# Altium footprint library CeleronLib_THD.PcbLib: 217 footprints (part 7 of 14)
Each footprint in its own frame and in the unit in brackets; x right, y up, seen from the top. Pads: shape width x height; smd on the part's side, far side on the other; paste and mask are expansions set on the pad; w line width, h text height; cw(c..) or ccw(c..) is an arc to the next point about the centre after c.
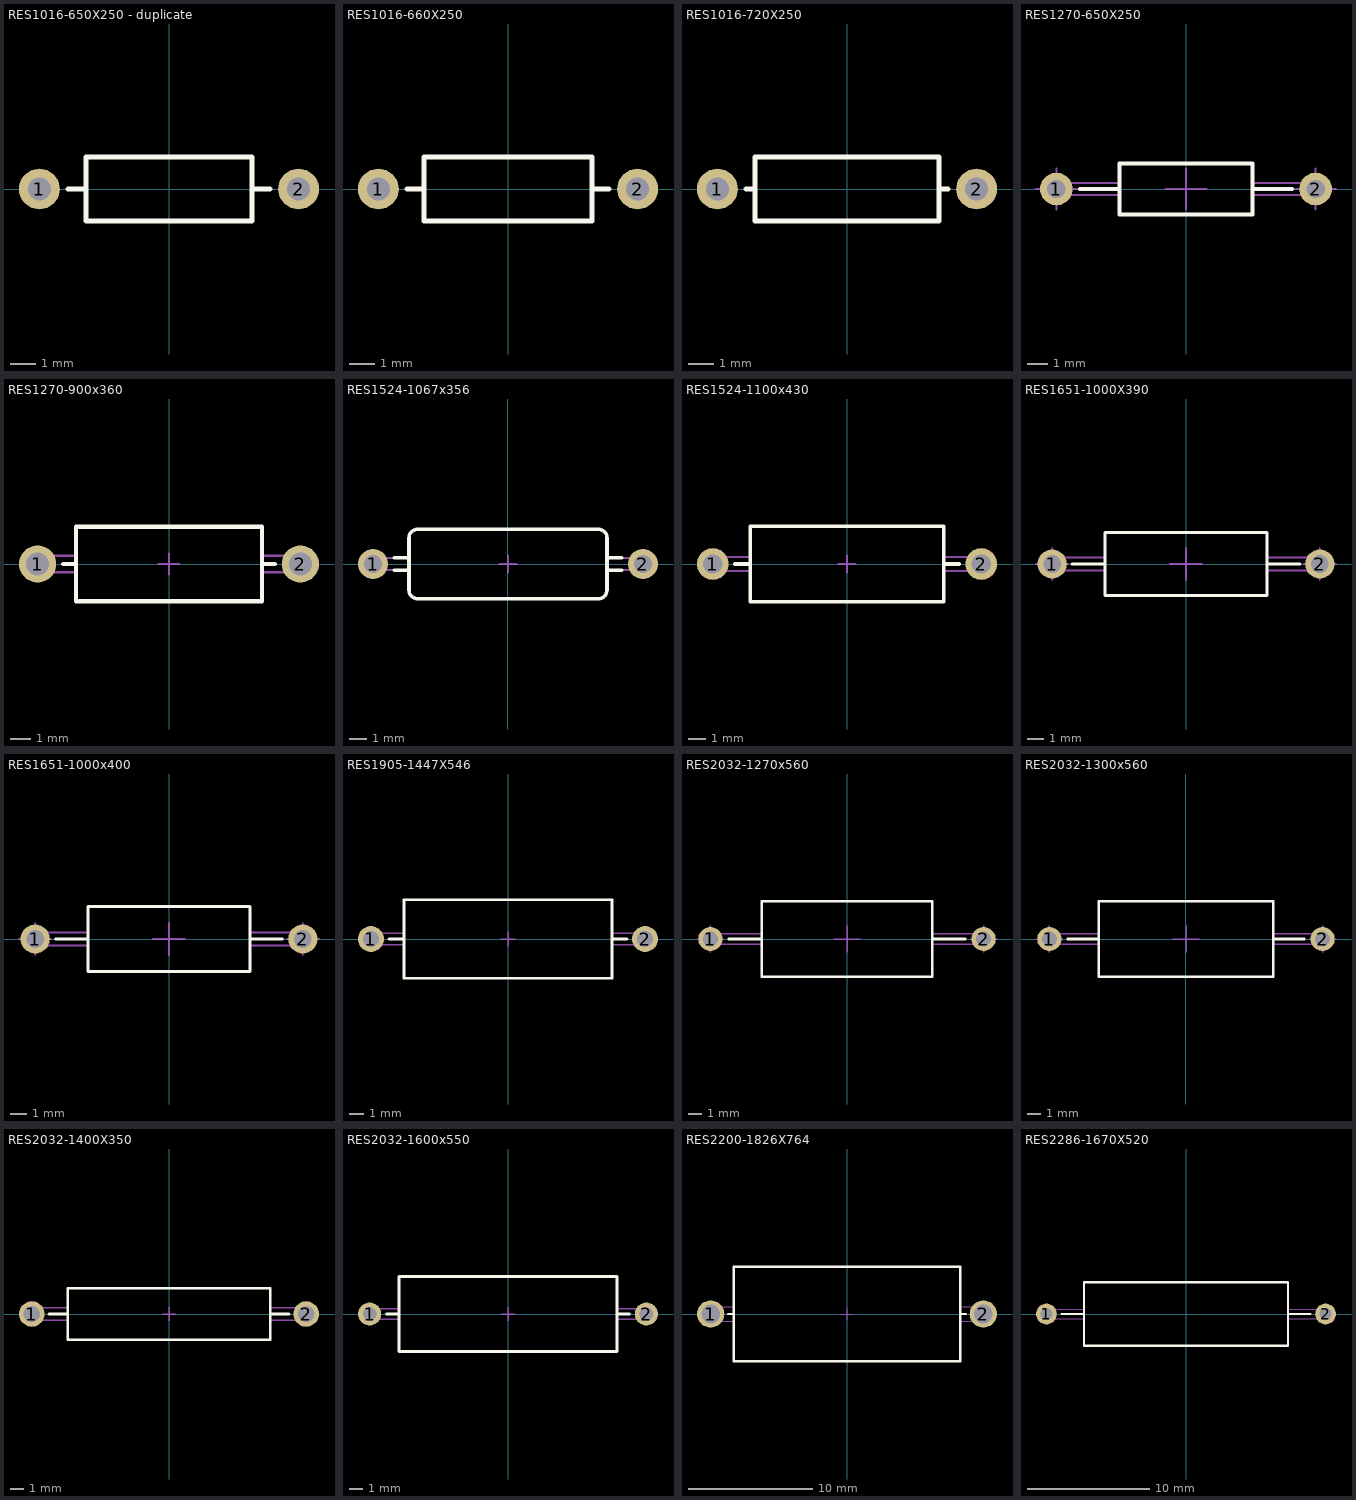
[diagram p6: the footprints below, top view; thin cyan lines are the x and y axes]

## RES1016-650X250 - duplicate [mm] "Resistor, Axial, Pad spacing 10.16 mm - Body Lengh 6.5mm X Body Diameter 2.5mm"
height 2.5
pads (2):
  round 1.6 hole 0.9: 1(-5.08,0) 2(5.08,0)
Top Overlay:
  lines w0.2: -3.95,0 -3.25,0 ; 3.25,0 3.95,0 ; -3.25,-1.25 -3.25,1.25 3.25,1.25 3.25,-1.25 -3.25,-1.25
Top Assy:
  lines w0.1: -3.95,0 -3.25,0 ; 3.25,0 3.95,0 ; -3.25,-1.25 3.25,-1.25 3.25,1.25 -3.25,1.25 -3.25,-1.25
3D body: height 2.51, standoff -3.2, extent -5.38,-1.27 5.38,1.26

## RES1016-660X250 [mm] "Resistor, Axial, Pad spacing 10.16 mm - Body Lengh 6.6mm X Body Diameter 2.5mm"
height 2.5
pads (2):
  round 1.6 hole 0.9: 1(-5.08,0) 2(5.08,0)
Top Overlay:
  lines w0.2: -3.95,0 -3.3,0 ; 3.3,0 3.95,0 ; -3.3,-1.25 -3.3,1.25 3.3,1.25 3.3,-1.25 -3.3,-1.25
Top Assy:
  lines w0.1: -3.95,0 -3.3,0 ; 3.3,0 3.95,0 ; -3.3,-1.25 3.3,-1.25 3.3,1.25 -3.3,1.25 -3.3,-1.25
3D body: height 2.5, standoff -3.1, extent -5.38,-1.25 5.38,1.25

## RES1016-720X250 [mm] "Resistor, Axial, Pad spacing 10.16 mm - Body Lengh 7.2mm X Body Diameter 2.5mm"
height 2.5
pads (2):
  round 1.6 hole 0.9: 1(-5.08,0) 2(5.08,0)
Top Overlay:
  lines w0.2: -3.95,0 -3.6,0 ; 3.6,0 3.95,0 ; -3.6,-1.25 3.6,-1.25 3.6,1.25 -3.6,1.25 -3.6,-1.25
Top Assy:
  lines w0.1: -3.95,0 -3.6,0 ; 3.6,0 3.95,0 ; -3.6,-1.25 -3.6,1.25 3.6,1.25 3.6,-1.25 -3.6,-1.25
3D body: height 2.5, standoff -3.2, extent -5.38,-1.25 5.38,1.25

## RES1270-650X250 [mm] "Resistor, Axial, Pad spacing 12.7 mm - Body Lengh 6.6mm X Body Diameter 2.5mm"
height 2.5
pads (2):
  round 1.6 hole 0.9: 1(-6.35,0) 2(6.35,0)
Top Overlay:
  lines w0.2: -5.2,0 -3.25,0 ; 3.25,0 5.2,0 ; -3.25,-1.25 -3.25,1.25 3.25,1.25 3.25,-1.25 -3.25,-1.25
Mechanical 8:
  lines w0.1: -7.35,0 -6.35,0 ; -6.35,-1 -6.35,0 ; -6.35,1 -6.35,0 ; -5.35,0 -6.35,0 ; -1,0 0,0 ; 0,-1 0,0 ; 0,1 0,0 ; 1,0 0,0 ; 5.35,0 6.35,0 ; 6.35,-1 6.35,0 ; 6.35,1 6.35,0 ; 7.35,0 6.35,0
Top Assy:
  lines w0.1: -3.25,-0.3 -6.336,-0.3 cw(c-6.35,0) -6.343,0.3 -3.25,0.3 ; 3.25,-0.3 6.35,-0.3 ccw(c6.35,0) 6.35,0.3 3.25,0.3 ; -3.25,-1.25 3.25,-1.25 3.25,1.25 -3.25,1.25 -3.25,-1.25
3D body: height 2.5, standoff -3.6, extent -6.65,-1.25 6.65,1.25

## RES1270-900x360 [mm] "Resistor, Axial, Pad spacing 12.7mm - Body Lengh 9mm X Body Diameter 3.6mm"
height 3.6
pads (2):
  round 1.8 hole 1.1: 1(-6.35,0) 2(6.35,0)
Top Overlay:
  lines w0.2: -5.113,0 -4.5,0 ; 4.5,0 5.113,0 ; -4.5,-1.8 -4.5,1.8 4.5,1.8 4.5,-1.8 -4.5,-1.8
Mechanical 8:
  lines w0.1: -6.85,0 -6.35,0 ; -6.35,-0.5 -6.35,0 ; -6.35,0.5 -6.35,0 ; -5.85,0 -6.35,0 ; -0.5,0 0,0 ; 0,-0.5 0,0 ; 0,0.5 0,0 ; 0.5,0 0,0 ; 5.85,0 6.35,0 ; 6.35,-0.5 6.35,0 ; 6.35,0.5 6.35,0 ; 6.85,0 6.35,0
Top Assy:
  lines w0.1: -4.5,-0.4 -6.35,-0.4 cw(c-6.35,0) -6.35,0.4 -4.5,0.4 ; 4.5,-0.4 6.35,-0.4 ccw(c6.35,0) 6.35,0.4 4.5,0.4 ; -4.5,-1.8 -4.5,1.8 4.5,1.8 4.5,-1.8 -4.5,-1.8
3D body: height 3.6, standoff -3.6, extent -6.75,-1.8 6.75,1.8

## RES1524-1067x356 [mm] "Resistor, Axial, Pad spacing 15.24mm - Body Lengh 10.67mm X Body Diameter 3.56mm"
height 3.94
pads (2):
  round 1.7 hole 1: 1(-7.62,0) 2(7.62,0)
Top Overlay:
  lines w0.2: -6.419,-0.345 -5.59,-0.345 ; -6.419,0.345 -5.59,0.345 ; -5.59,-0.702 -5.59,-1.47 ; 5.59,-0.345 6.419,-0.345 ; 5.59,0.345 6.419,0.345 ; -5.59,-1.47 ccw(c-5.09,-1.47) -5.09,-1.97 5.09,-1.97 ccw(c5.09,-1.47) 5.59,-1.47 5.59,1.47 ccw(c5.09,1.47) 5.09,1.97 -5.09,1.97 ccw(c-5.09,1.47) -5.59,1.47 -5.59,-1.47
Mechanical 8:
  lines w0.1: -8.12,0 -7.62,0 ; -7.62,-0.5 -7.62,0 ; -7.62,0.5 -7.62,0 ; -7.12,0 -7.62,0 ; -0.5,0 0,0 ; 0,-0.5 0,0 ; 0,0.5 0,0 ; 0.5,0 0,0 ; 7.12,0 7.62,0 ; 7.62,-0.5 7.62,0 ; 7.62,0.5 7.62,0 ; 8.12,0 7.62,0
Top Assy:
  lines w0.1: -5.59,-0.702 -5.59,-1.47 ; -5.59,-0.345 -7.62,-0.345 cw(c-7.62,0) -7.62,0.345 -5.59,0.345 ; 5.59,-0.345 7.62,-0.345 ccw(c7.62,0) 7.62,0.345 5.59,0.345 ; -5.59,-1.47 ccw(c-5.09,-1.47) -5.09,-1.97 5.09,-1.97 ccw(c5.09,-1.47) 5.59,-1.47 5.59,1.47 ccw(c5.09,1.47) 5.09,1.97 -5.09,1.97 ccw(c-5.09,1.47) -5.59,1.47 -5.59,-1.47
3D body: height 3.94, standoff -2.7, extent -7.965,-1.956 7.965,1.956

## RES1524-1100x430 [mm] "Resistor, Axial, Pad spacing 15.24 mm - Body Lengh 11mm X Body Diameter 4.3mm"
height 4.3
pads (2):
  round 1.8 hole 1.1: 1(-7.62,0) 2(7.62,0)
Top Overlay:
  lines w0.2: -6.383,0 -5.5,0 ; 5.5,0 6.383,0 ; -5.5,-2.15 -5.5,2.15 5.5,2.15 5.5,-2.15 -5.5,-2.15
Mechanical 8:
  lines w0.1: -8.12,0 -7.62,0 ; -7.62,-0.5 -7.62,0 ; -7.62,0.5 -7.62,0 ; -7.12,0 -7.62,0 ; -0.5,0 0,0 ; 0,-0.5 0,0 ; 0,0.5 0,0 ; 0.5,0 0,0 ; 7.12,0 7.62,0 ; 7.62,-0.5 7.62,0 ; 7.62,0.5 7.62,0 ; 8.12,0 7.62,0
Top Assy:
  lines w0.1: -5.5,-0.4 -7.62,-0.4 cw(c-7.62,0) -7.62,0.4 -5.5,0.4 ; 5.5,-0.4 7.62,-0.4 ccw(c7.62,0) 7.62,0.4 5.5,0.4 ; -5.5,-2.15 -5.5,2.15 5.5,2.15 5.5,-2.15 -5.5,-2.15
3D body: height 4.3, standoff -3.8, extent -8.02,-2.15 8.02,2.15

## RES1651-1000X390 [mm] "Resistor, Axial, Pad spacing 16.51mm - Body Lengh 10mm X Body Diameter 3.9mm"
height 3.9
pads (2):
  round 1.8 hole 1.1: 1(-8.255,0) 2(8.255,0)
Top Overlay:
  lines w0.2: -7.018,0 -5,0 ; 5,0 7.018,0 ; -5,-1.95 -5,1.95 ; -5,-1.95 5,-1.95 ; -5,-1.95 5,-1.95 ; -5,-1.95 -5,1.95 ; -5,1.95 5,1.95 ; -5,1.95 5,1.95 ; 5,-1.95 5,1.95 ; 5,-1.95 5,1.95
Mechanical 8:
  lines w0.1: -9.255,0 -8.255,0 ; -8.255,-1 -8.255,0 ; -8.255,1 -8.255,0 ; -7.255,0 -8.255,0 ; -1,0 0,0 ; 0,-1 0,0 ; 0,1 0,0 ; 1,0 0,0 ; 7.255,0 8.255,0 ; 8.255,-1 8.255,0 ; 8.255,1 8.255,0 ; 9.255,0 8.255,0
Top Assy:
  lines w0.1: -5,-0.4 -8.255,-0.4 cw(c-8.255,0) -8.255,0.4 -5,0.4 ; 5,-0.4 8.255,-0.4 ccw(c8.255,0) 8.255,0.4 5,0.4 ; -5,-1.95 -5,1.95 5,1.95 5,-1.95 -5,-1.95
3D body: height 3.9, standoff -3.8, extent -8.645,-1.95 8.645,1.95

## RES1651-1000x400 [mm] "Resistor, Axial, Pad spacing 16.51 mm - Body Lengh 10mm X Body Diameter 4mm"
height 4
pads (2):
  round 1.8 hole 1.1: 1(-8.255,0) 2(8.255,0)
Top Overlay:
  lines w0.2: -7,0 -5,0 ; 5,0 7,0 ; -5,-2 5,-2 5,2 -5,2 -5,-2
Mechanical 8:
  lines w0.1: -9.255,0 -8.255,0 ; -8.255,-1 -8.255,0 ; -8.255,1 -8.255,0 ; -7.255,0 -8.255,0 ; -1,0 0,0 ; 0,-1 0,0 ; 0,1 0,0 ; 1,0 0,0 ; 7.255,0 8.255,0 ; 8.255,-1 8.255,0 ; 8.255,1 8.255,0 ; 9.255,0 8.255,0
Top Assy:
  lines w0.1: -5,-0.4 -8.255,-0.4 cw(c-8.255,0) -8.255,0.4 -5,0.4 ; 5,-0.4 8.255,-0.4 ccw(c8.255,0) 8.255,0.4 5,0.4 ; -5,-2 5,-2 5,2 -5,2 -5,-2
3D body: height 4, standoff -3.1, extent -8.645,-1.95 8.665,2.05

## RES1905-1447X546 [mm] "Resistor, Axial, Pad spacing 19.05mm - Body Lengh 14.22mm X Body Diameter 5.21mm"
height 5.46
pads (2):
  round 1.8 hole 1.1: 1(-9.525,0) 2(9.525,0)
Top Overlay:
  lines w0.2: -8.275,0 -7.235,0 ; 7.235,0 8.275,0 ; -7.235,-2.73 -7.235,2.73 7.235,2.73 7.235,-2.73 -7.235,-2.73
Mechanical 8:
  lines w0.1: -10.025,0 -9.525,0 ; -9.525,-0.5 -9.525,0 ; -9.525,0.5 -9.525,0 ; -9.025,0 -9.525,0 ; -0.5,0 0,0 ; 0,-0.5 0,0 ; 0,0.5 0,0 ; 0.5,0 0,0 ; 9.025,0 9.525,0 ; 9.525,-0.5 9.525,0 ; 9.525,0.5 9.525,0 ; 10.025,0 9.525,0
Top Assy:
  lines w0.1: -7.235,-0.4 -9.525,-0.4 cw(c-9.525,0) -9.525,0.4 -7.235,0.4 ; 7.235,-0.4 9.525,-0.4 ccw(c9.525,0) 9.525,0.4 7.235,0.4 ; -7.235,-2.73 -7.235,2.73 7.235,2.73 7.235,-2.73 -7.235,-2.73
3D body: height 5.46, standoff -3.6, extent -9.931,-2.73 9.932,2.73

## RES2032-1270x560 [mm] "Resistor, Axial, Leads spacing 20.32mm, Lead Dia. 0.8, Body Lengh 12.7mm, Diameter 5.6mm"
height 5.6
pads (2):
  round 1.8 hole 1.1: 1(-10.16,0) 2(10.16,0)
Top Overlay:
  lines w0.2: -8.8,0 -6.35,0 ; 6.35,0 8.8,0 ; -6.35,-2.8 6.35,-2.8 6.35,2.8 -6.35,2.8 -6.35,-2.8
Mechanical 8:
  lines w0.1: -11.16,0 -10.16,0 ; -10.16,-1 -10.16,0 ; -10.16,1 -10.16,0 ; -9.16,0 -10.16,0 ; -1,0 0,0 ; 0,-1 0,0 ; 0,1 0,0 ; 1,0 0,0 ; 9.16,0 10.16,0 ; 10.16,-1 10.16,0 ; 10.16,1 10.16,0 ; 11.16,0 10.16,0
Top Assy:
  lines w0.1: -6.35,-0.4 -10.16,-0.4 cw(c-10.16,0) -10.16,0.4 -6.35,0.4 ; 6.35,-0.4 10.16,-0.4 ccw(c10.16,0) 10.16,0.4 6.35,0.4 ; -6.35,-2.8 6.35,-2.8 6.35,2.8 -6.35,2.8 -6.35,-2.8
3D body: height 5.6, standoff -3.8, extent -10.59,-2.8 10.59,2.8

## RES2032-1300x560 [mm] "Resistor, Axial, Leads spacing 20.32mm, Lead Dia. 0.8, Body Lengh 13mm, Diameter 5.6mm"
height 5.6
pads (2):
  round 1.8 hole 1.1: 1(-10.16,0) 2(10.16,0)
Top Overlay:
  lines w0.2: -8.8,0 -6.5,0 ; 6.5,0 8.8,0 ; -6.5,-2.8 6.5,-2.8 6.5,2.8 -6.5,2.8 -6.5,-2.8
Mechanical 8:
  lines w0.1: -11.16,0 -10.16,0 ; -10.16,-1 -10.16,0 ; -10.16,1 -10.16,0 ; -9.16,0 -10.16,0 ; -1,0 0,0 ; 0,-1 0,0 ; 0,1 0,0 ; 1,0 0,0 ; 9.16,0 10.16,0 ; 10.16,-1 10.16,0 ; 10.16,1 10.16,0 ; 11.16,0 10.16,0
Top Assy:
  lines w0.1: -6.5,-0.4 -10.16,-0.4 cw(c-10.16,0) -10.16,0.4 -6.5,0.4 ; 6.5,-0.4 10.16,-0.4 ccw(c10.16,0) 10.16,0.4 6.5,0.4 ; -6.5,-2.8 6.5,-2.8 6.5,2.8 -6.5,2.8 -6.5,-2.8
3D body: height 5.6, standoff -3.8, extent -10.59,-2.8 10.59,2.8

## RES2032-1400X350 [mm] "Resistor, Axial, Pad spacing 20.32mm - Body Lengh 14mm X Body Diameter 3.5mm"
height 3.8
pads (2):
  round 1.9 hole 1.2: 1(-10.16,0) 2(10.16,0)
Top Overlay:
  lines w0.2: -8.887,0 -7.5,0 ; 7.5,0 8.887,0 ; -7.5,-1.9 -7.5,1.9 7.5,1.9 7.5,-1.9 -7.5,-1.9
Mechanical 8:
  lines w0.1: -10.66,0 -10.16,0 ; -10.16,-0.5 -10.16,0 ; -10.16,0.5 -10.16,0 ; -9.66,0 -10.16,0 ; -0.5,0 0,0 ; 0,-0.5 0,0 ; 0,0.5 0,0 ; 0.5,0 0,0 ; 9.66,0 10.16,0 ; 10.16,-0.5 10.16,0 ; 10.16,0.5 10.16,0 ; 10.66,0 10.16,0
Top Assy:
  lines w0.1: -7.5,-0.45 -10.16,-0.45 cw(c-10.16,0) -10.16,0.45 -7.5,0.45 ; 7.5,-0.45 10.16,-0.45 ccw(c10.16,0) 10.16,0.45 7.5,0.45 ; -7.5,-1.9 -7.5,1.9 7.5,1.9 7.5,-1.9 -7.5,-1.9
3D body: height 3.8, standoff -3.6, extent -10.61,-1.9 10.61,1.9

## RES2032-1600x550 [mm] "Resistor, Axial, Pad spacing 20.32mm - Body Lengh 16mm X Body Diameter 5.5mm"
height 5.5
pads (2):
  round 1.7 hole 1: 1(-10.16,0) 2(10.16,0)
Top Overlay:
  lines w0.2: -8.91,0 -8,0 ; 8,0 8.91,0 ; -8,-2.75 -8,2.75 8,2.75 8,-2.75 -8,-2.75
Mechanical 8:
  lines w0.1: -10.66,0 -10.16,0 ; -10.16,-0.5 -10.16,0 ; -10.16,0.5 -10.16,0 ; -9.66,0 -10.16,0 ; -0.5,0 0,0 ; 0,-0.5 0,0 ; 0,0.5 0,0 ; 0.5,0 0,0 ; 9.66,0 10.16,0 ; 10.16,-0.5 10.16,0 ; 10.16,0.5 10.16,0 ; 10.66,0 10.16,0
Top Assy:
  lines w0.1: -8,-0.375 -10.16,-0.375 cw(c-10.16,0) -10.16,0.375 -8,0.375 ; 8,-0.375 10.16,-0.375 ccw(c10.16,0) 10.16,0.375 8,0.375 ; -8,-2.75 -8,2.75 8,2.75 8,-2.75 -8,-2.75
3D body: height 5.5, standoff -3.6, extent -10.535,-2.75 10.535,2.75

## RES2200-1826X764 [mm] "Resistor, Axial, Pad spacing 22mm - Body Lengh 18.26mm X Body Diameter 7.64mm"
height 7.64
pads (2):
  round 2.2 hole 1.5: 1(-11,0) 2(11,0)
Top Overlay:
  lines w0.2: -9.575,0 -9.13,0 ; 9.13,0 9.575,0 ; -9.13,-3.82 9.13,-3.82 9.13,3.82 -9.13,3.82 -9.13,-3.82
Mechanical 8:
  lines w0.1: -11.5,0 -11,0 ; -11,-0.5 -11,0 ; -11,0.5 -11,0 ; -10.5,0 -11,0 ; -0.5,0 0,0 ; 0,-0.5 0,0 ; 0,0.5 0,0 ; 0.5,0 0,0 ; 10.5,0 11,0 ; 11,-0.5 11,0 ; 11,0.5 11,0 ; 11.5,0 11,0
Top Assy:
  lines w0.1: -9.13,-3.82 9.13,-3.82 9.13,3.82 -9.13,3.82 -9.13,-3.82
Top Courtyard:
  lines w0.1: -9.13,-0.6 -11,-0.6 cw(c-11,0) -11,0.6 -9.13,0.6 ; 9.13,-0.6 11,-0.6 ccw(c11,0) 11,0.6 9.13,0.6
3D body: height 7.65, standoff -3.6, extent -11.6,-3.82 11.6,3.82

## RES2286-1670X520 [mm] "Resistor, Axial, Pad spacing 22.22 mm - Body Lengh 16.7mm X Body Diameter 5.2mm"
height 5.2
pads (2):
  round 1.7 hole 1: 1(-11.43,0) 2(11.43,0)
Top Overlay:
  lines w0.2: -10.16,0 -8.35,0 ; 8.35,0 10.16,0 ; -8.35,-2.6 -8.35,2.6 8.35,2.6 8.35,-2.6 -8.35,-2.6
Top Assy:
  lines w0.1: -11.43,-0.4 -8.35,-0.4 ; -11.43,0.4 -8.35,0.4 ; 8.35,-0.4 11.43,-0.4 ; 8.35,0.4 11.43,0.4 ; -8.35,-2.6 8.35,-2.6 8.35,2.6 -8.35,2.6 -8.35,-2.6
3D body: height 5.2, standoff -3.6, extent -11.82,-2.6 11.82,2.6